# Altium footprint library Connektor.PcbLib: 305 footprints (part 3 of 20)
Each footprint in its own frame and in the unit in brackets; x right, y up, seen from the top. Pads: shape width x height; smd on the part's side, far side on the other; paste and mask are expansions set on the pad; w line width, h text height; cw(c..) or ccw(c..) is an arc to the next point about the centre after c.
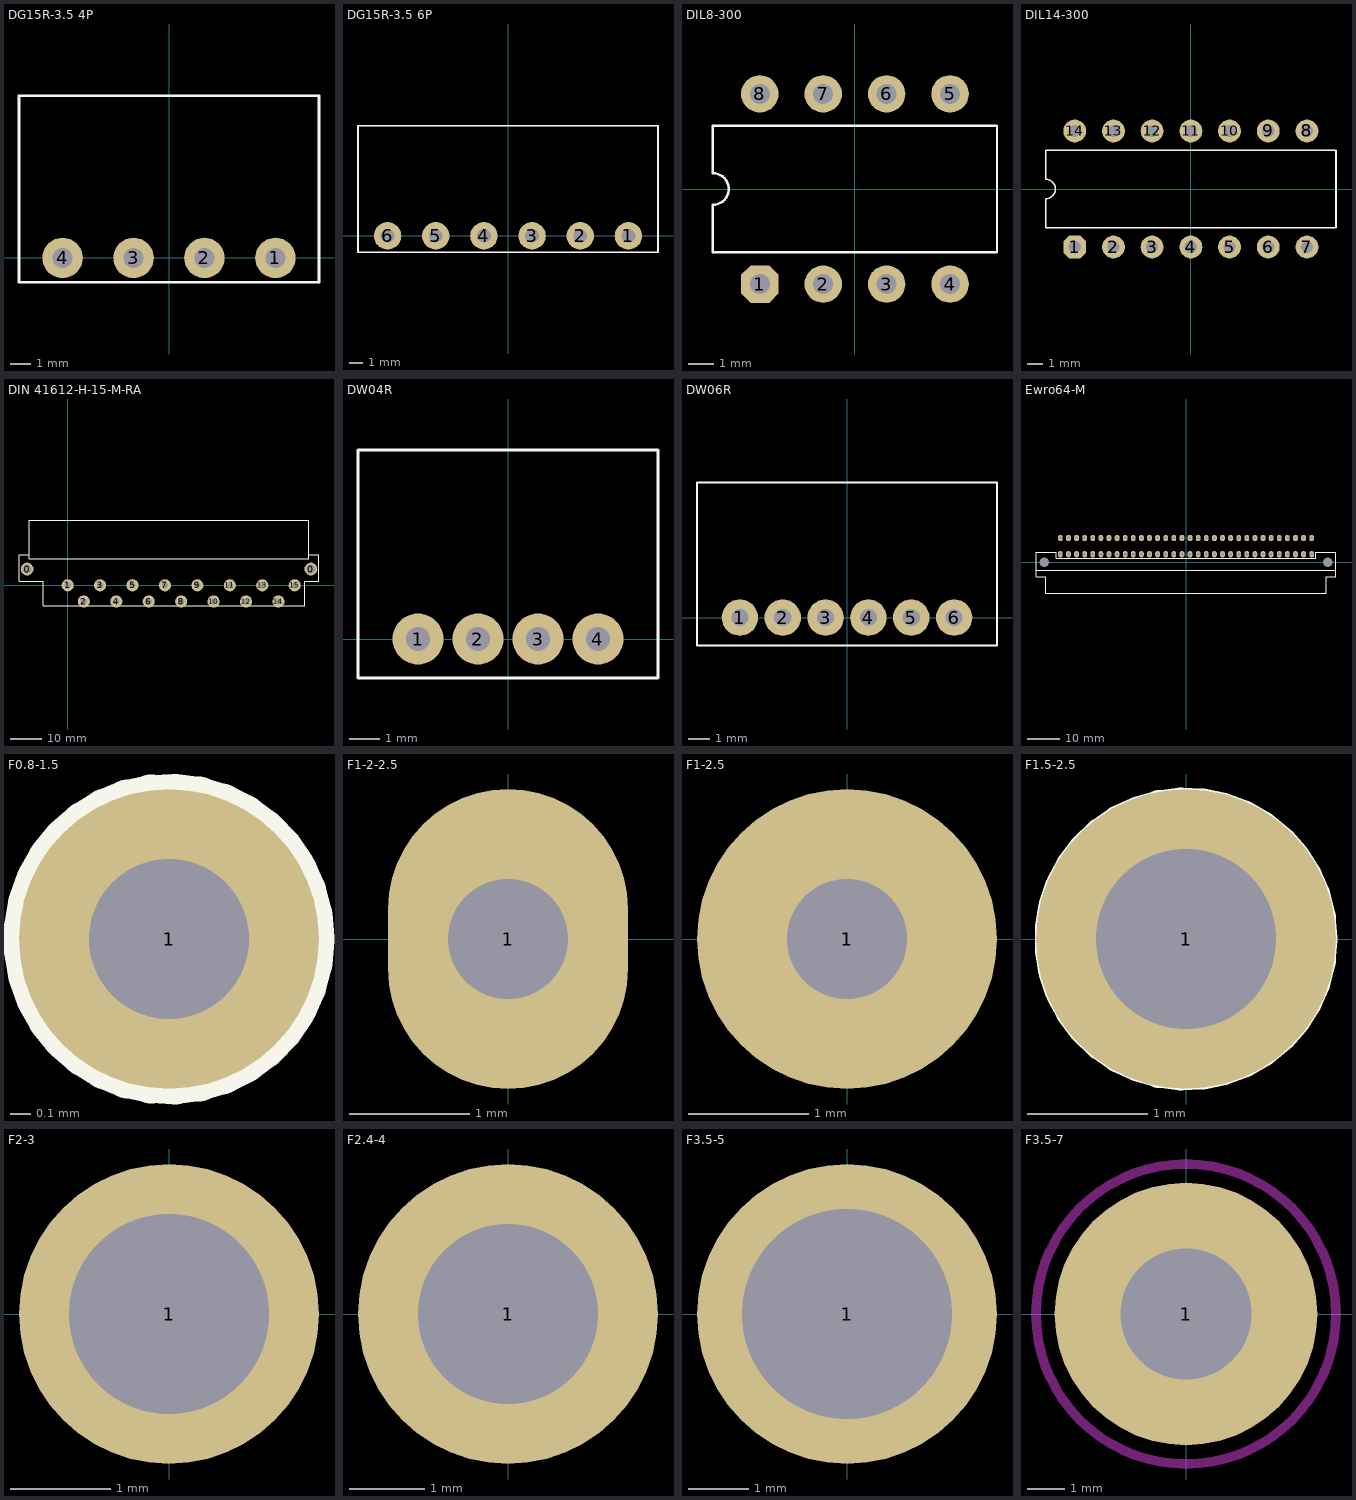
[diagram p2: the footprints below, top view; thin cyan lines are the x and y axes]

## DG15R-3.5 4P [mm]
pads (4):
  round 2 hole 1: 1(5.25,0) 2(1.75,0) 3(-1.75,0) 4(-5.25,0)
TopOverlay:
  lines w0.127: -7.4,-1.2 7.4,-1.2 7.4,8 -7.4,8 -7.4,-1.2

## DG15R-3.5 6P [mm]
pads (6):
  round 2 hole 1: 1(8.75,0) 2(5.25,0) 3(1.75,0) 4(-1.75,0) 5(-5.25,0) 6(-8.75,0)
TopOverlay:
  lines w0.127: -10.9,-1.2 10.9,-1.2 10.9,8 -10.9,8 -10.9,-1.2

## DIL8-300 [mm]
pads (8):
  oct 1.5x1.5 hole 0.8: 1(-3.81,-3.81)
  round 1.5 hole 0.8: 2(-1.27,-3.81) 3(1.27,-3.81) 4(3.81,-3.81) 5(3.81,3.81) 6(1.27,3.81) 7(-1.27,3.81) 8(-3.81,3.81)
TopOverlay:
  lines w0.1: -5.69,-2.54 -5.69,-0.635 ccw(c-5.69,0) -5.69,0.635 -5.69,2.54 5.69,2.54 5.69,-2.54 -5.69,-2.54
3D body: height 3.88, standoff -2.5, extent -5.69,-3.96 5.69,3.96

## DIL14-300 [mm]
pads (14):
  oct 1.5x1.5 hole 0.8: 1(-7.62,-3.81)
  round 1.5 hole 0.8: 2(-5.08,-3.81) 3(-2.54,-3.81) 4(0,-3.81) 5(2.54,-3.81) 6(5.08,-3.81) 7(7.62,-3.81) 8(7.62,3.81) 9(5.08,3.81) 10(2.54,3.81) 11(0,3.81) 12(-2.54,3.81) 13(-5.08,3.81) 14(-7.62,3.81)
TopOverlay:
  lines w0.1: -9.525,-2.54 9.525,-2.54 9.525,2.54 -9.525,2.54 -9.525,0.635 cw(c-9.525,0) -9.525,-0.635 -9.525,-2.54
3D body: height 3.88, standoff -2.5, extent -9.5,-3.96 9.5,3.96

## DIN 41612-H-15-M-RA [mm]
pads (17):
  round 4 hole 2.8: 0(-12.7,5.08) 0(76.2,5.08)
  round 3.8 hole 2: 1(0,0) 2(5.08,-5.08) 3(10.16,0) 4(15.24,-5.08) 5(20.32,0) 6(25.4,-5.08) 7(30.48,0) 8(35.56,-5.08) 9(40.64,0) 10(45.72,-5.08) 11(50.8,0) 12(55.88,-5.08) 13(60.96,0) 14(66.04,-5.08) 15(71.12,0)
TopOverlay:
  lines w0.1: -12.065,9.525 -12.065,8.255 75.565,8.255 75.565,9.525 ; -12.065,9.525 -15.24,9.525 -15.24,1.27 -7.62,1.27 -7.62,-6.35 74.295,-6.35 74.295,1.27 78.74,1.27 78.74,9.525 75.565,9.525 ; -12.065,9.525 -12.065,20.32 75.565,20.32 75.565,9.525
3D body: height 11.3, standoff -3.4, extent -15.23,-6.02 78.73,20.33

## DW04R [mm]
height 4.9
pads (4):
  round 1.7 hole 0.8: 1(-3,0) 2(-1,0) 3(1,0) 4(3,0)
TopOverlay:
  lines w0.1: -5,-1.3 -5,6.3 5,6.3 5,-1.3 -5,-1.3

## DW06R [mm]
height 4.9
pads (6):
  round 1.7 hole 0.8: 1(-5,0) 2(-3,0) 3(-1,0) 4(1,0) 5(3,0) 6(5,0)
TopOverlay:
  lines w0.1: -7,-1.3 7,-1.3 7,6.3 -7,6.3 -7,-1.3

## Ewro64-M [mm]
pads (66):
  oval 1.5x2 hole 1: 1(39.37,7.62) 2(36.83,7.62) 3(34.29,7.62) 4(31.75,7.62) 5(29.21,7.62) 6(26.67,7.62) 7(24.13,7.62) 8(21.59,7.62) 9(19.05,7.62) 10(16.51,7.62) 11(13.97,7.62) 12(11.43,7.62) 13(8.89,7.62) 14(6.35,7.62) 15(3.81,7.62) 16(1.27,7.62) 17(-1.27,7.62) 18(-3.81,7.62) 19(-6.35,7.62) 20(-8.89,7.62) 21(-11.43,7.62) 22(-13.97,7.62) 23(-16.51,7.62) 24(-19.05,7.62) 25(-21.59,7.62) 26(-24.13,7.62) 27(-26.67,7.62) 28(-29.21,7.62) 29(-31.75,7.62) 30(-34.29,7.62) 31(-36.83,7.62) 32(-39.37,7.62) 33(39.37,2.54) 34(36.83,2.54) 35(34.29,2.54) 36(31.75,2.54) 37(29.21,2.54) 38(26.67,2.54) 39(24.13,2.54) 40(21.59,2.54) 41(19.05,2.54) 42(16.51,2.54) 43(13.97,2.54) 44(11.43,2.54) 45(8.89,2.54) 46(6.35,2.54) 47(3.81,2.54) 48(1.27,2.54) 49(-1.27,2.54) 50(-3.81,2.54) 51(-6.35,2.54) 52(-8.89,2.54) 53(-11.43,2.54) 54(-13.97,2.54) 55(-16.51,2.54) 56(-19.05,2.54) 57(-21.59,2.54) 58(-24.13,2.54) 59(-26.67,2.54) 60(-29.21,2.54) 61(-31.75,2.54) 62(-34.29,2.54) 63(-36.83,2.54) 64(-39.37,2.54)
  round 0 hole 3: 65(-44.45,0) 66(44.45,0)
TopOverlay:
  lines w0.127: -46.99,-2.54 -46.99,3.175 -40.64,3.175 -40.64,1.27 40.64,1.27 40.64,3.175 46.99,3.175 46.99,-2.54 ; -46.99,-2.54 -46.99,-4.572 -43.942,-4.572 -43.942,-9.652 43.942,-9.652 43.942,-4.572 46.99,-4.572 46.99,-2.54 ; -46.99,-2.54 46.99,-2.54

## F0.8-1.5 [mm]
pads (1):
  round 1.5 hole 0.8: 1(0,0)
TopOverlay:
  circle w0.254: c0,0 r0.7

## F1-2-2.5 [mm]
pads (1):
  oval 2x2.5 hole 1: 1(0,0)
TopOverlay:
  circle w0.254: c0,0 r0.75

## F1-2.5 [mm]
pads (1):
  round 2.5 hole 1: 1(0,0)
TopOverlay:
  circle w0.254: c0,0 r0.75

## F1.5-2.5 [mm]
pads (1):
  round 2.5 hole 1.5: 1(0,0)
TopOverlay:
  circle w0.254: c0,0 r1.136

## F2-3 [mm]
pads (1):
  round 3 hole 2: 1(0,0)
TopOverlay:
  circle w0.254: c0,0 r1.136

## F2.4-4 [mm]
pads (1):
  round 4 hole 2.4: 1(0,0)
TopOverlay:
  circle w0.254: c0,0 r1.2

## F3.5-5 [mm]
pads (1):
  round 5 hole 3.5: 1(0,0)

## F3.5-7 [mm]
pads (1):
  round 7 hole 3.5: 1(0,0)
KeepOutLayer:
  circle w0.254: c0,0 r4